# Altium footprint library YQPOWER.PcbLib: 215 footprints (part 4 of 14)
Each footprint in its own frame and in the unit in brackets; x right, y up, seen from the top. Pads: shape width x height; smd on the part's side, far side on the other; paste and mask are expansions set on the pad; w line width, h text height; cw(c..) or ccw(c..) is an arc to the next point about the centre after c.
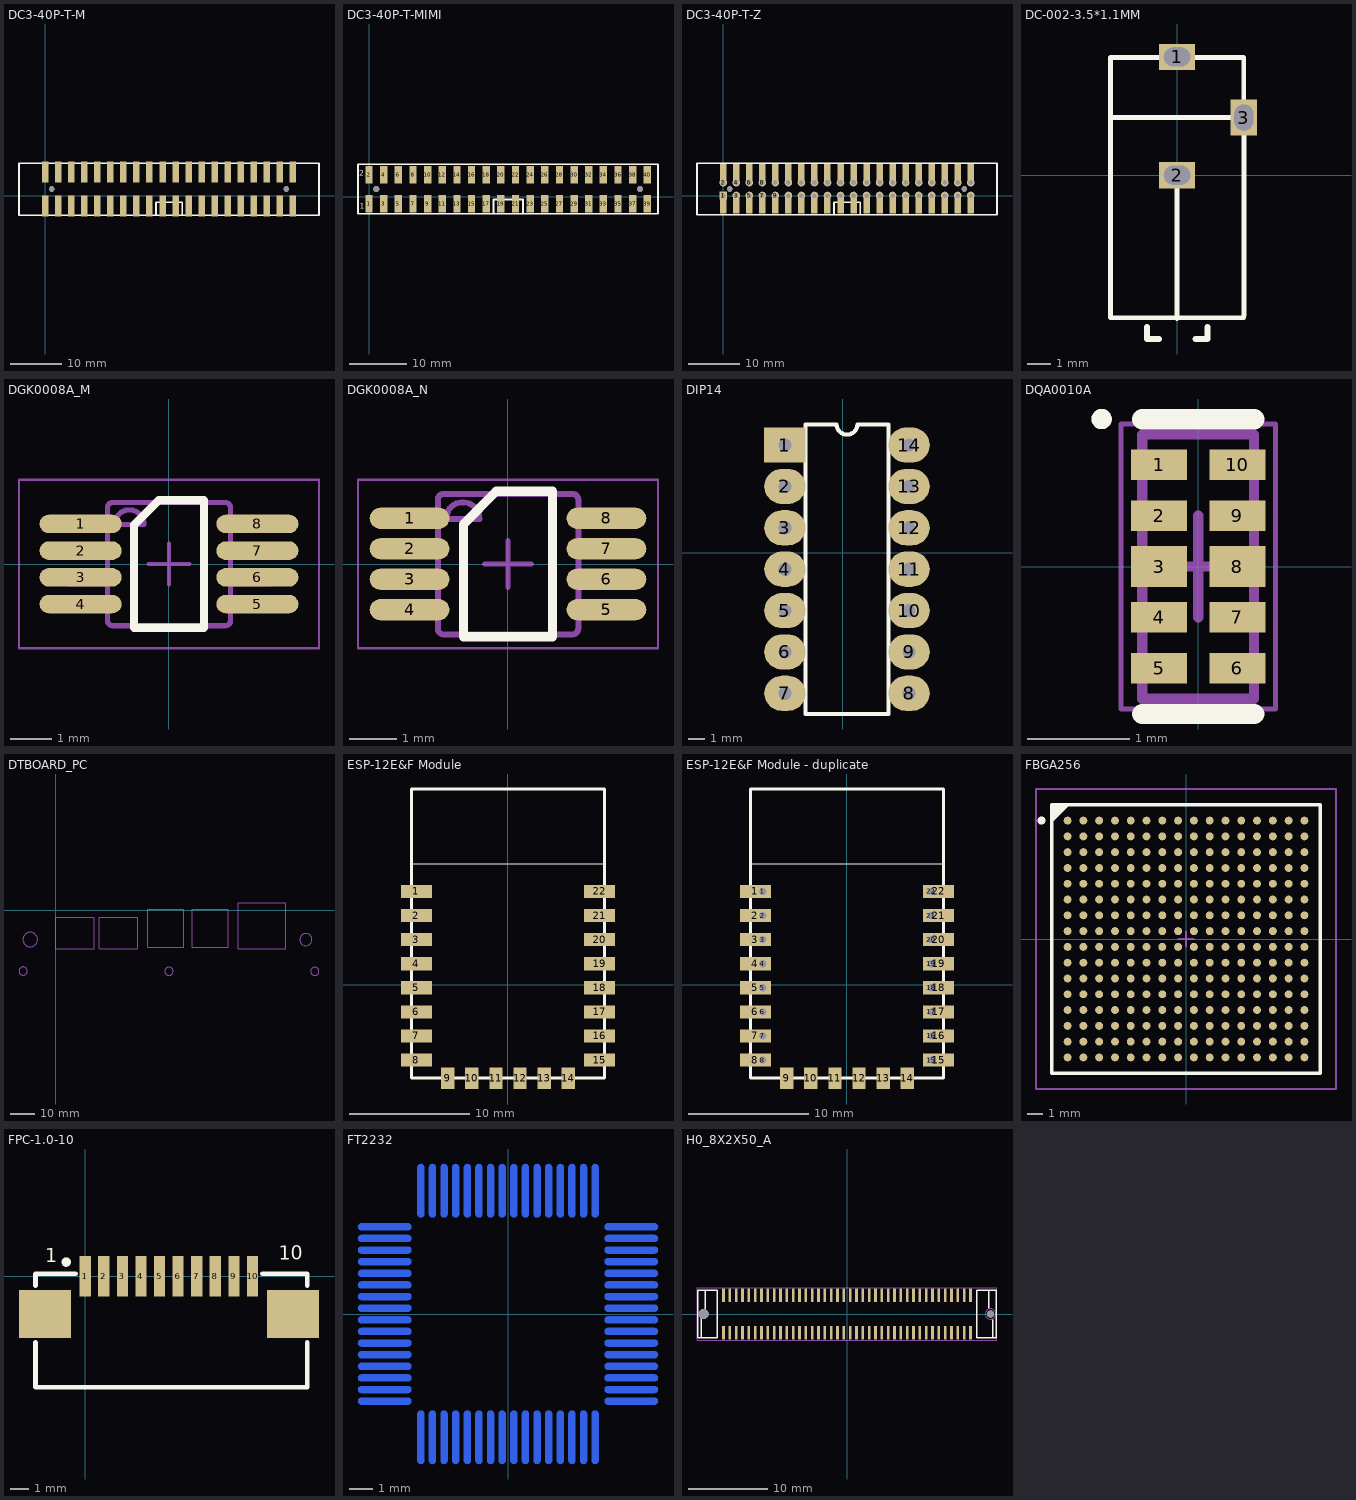
[diagram p3: the footprints below, top view; thin cyan lines are the x and y axes]

## DC3-40P-T-M [mil] "Connector; Header; 20x2 Position"
pads (42):
  round 39.37 hole 45.28: 0(50,51.57) 0(1850,51.57)
  rect 50x160 smd: 1(0,-77.87) 2(0,181.02) 3(100,-77.87) 4(100,181.02) 5(200,-77.87) 6(200,181.02) 7(300,-77.87) 8(300,181.02) 9(400,-77.87) 10(400,181.02) 11(500,-77.87) 12(500,181.02) 13(600,-77.87) 14(600,181.02) 15(700,-77.87) 16(700,181.02) 17(800,-77.87) 18(800,181.02) 19(900,-77.87) 20(900,181.02) 21(1000,-77.87) 22(1000,181.02) 23(1100,-77.87) 24(1100,181.02) 25(1200,-77.87) 26(1200,181.02) 27(1300,-77.87) 28(1300,181.02) 29(1400,-77.87) 30(1400,181.02) 31(1500,-77.87) 32(1500,181.02) 33(1600,-77.87) 34(1600,181.02) 35(1700,-77.87) 36(1700,181.02) 37(1800,-77.87) 38(1800,181.02) 39(1900,-77.87) 40(1900,181.02)
Top Overlay:
  lines w11.81: 850,-147.64 850,-50 1050,-50 1050,-147.64 ; -201.57,-148.82 -201.57,249.61 2101.18,249.61 2101.18,-148.82 -201.57,-148.82

## DC3-40P-T-MIMI [mil] "Connector; Header; 20x2 Position"
pads (42):
  round 39.37 hole 43.31: 0(50,51.57) 0(1850,51.57)
  rect 50x120 smd: 1(0,-47.87) 2(0,150) 3(100,-47.87) 4(100,150) 5(200,-47.87) 6(200,150) 7(300,-47.87) 8(300,150) 9(400,-47.87) 10(400,150) 11(500,-47.87) 12(500,150) 13(600,-47.87) 14(600,150) 15(700,-47.87) 16(700,150) 17(800,-47.87) 18(800,150) 19(900,-47.87) 20(900,150) 21(1000,-47.87) 22(1000,150) 23(1100,-47.87) 24(1100,150) 25(1200,-47.87) 26(1200,150) 27(1300,-47.87) 28(1300,150) 29(1400,-47.87) 30(1400,150) 31(1500,-47.87) 32(1500,150) 33(1600,-47.87) 34(1600,150) 35(1700,-47.87) 36(1700,150) 37(1800,-47.87) 38(1800,150) 39(1900,-47.87) 40(1900,150)
Top Overlay:
  lines w11.81: 850.39,-117.32 850.39,-19.68 1050.39,-19.68 1050.39,-117.32 ; -75.59,-117.32 -75.59,220.87 1972.83,220.87 1972.83,-117.32 -75.59,-117.32
  text "1" at -62.99,-97.64 h65
  text "2" at -65.75,129.92 h65

## DC3-40P-T-Z [mm] "Connector; Header; 20x2 Position"
pads (82):
  round 1 hole 1.15: 0(1.27,1.31) 0(46.99,1.31)
  rect 1.27x3.556 smd: 1(0,-1.738) 2(0,4.358) 3(2.54,-1.738) 4(2.54,4.358) 5(5.08,-1.738) 6(5.08,4.358) 7(7.62,-1.738) 8(7.62,4.358) 9(10.16,-1.738) 10(10.16,4.358) 11(12.7,-1.738) 12(12.7,4.358) 13(15.24,-1.738) 14(15.24,4.358) 15(17.78,-1.738) 16(17.78,4.358) 17(20.32,-1.738) 18(20.32,4.358) 19(22.86,-1.738) 20(22.86,4.358) 21(25.4,-1.738) 22(25.4,4.358) 23(27.94,-1.738) 24(27.94,4.358) 25(30.48,-1.738) 26(30.48,4.358) 27(33.02,-1.738) 28(33.02,4.358) 29(35.56,-1.738) 30(35.56,4.358) 31(38.1,-1.738) 32(38.1,4.358) 33(40.64,-1.738) 34(40.64,4.358) 35(43.18,-1.738) 36(43.18,4.358) 37(45.72,-1.738) 38(45.72,4.358) 39(48.26,-1.738) 40(48.26,4.358)
  rect 1.5x1.5 hole 0.9: 1(0,0)
  round 1.5 hole 0.9: 2(0,2.54) 3(2.54,0) 4(2.54,2.54) 5(5.08,0) 6(5.08,2.54) 7(7.62,0) 8(7.62,2.54) 9(10.16,0) 10(10.16,2.54) 11(12.7,0) 12(12.7,2.54) 13(15.24,0) 14(15.24,2.54) 15(17.78,0) 16(17.78,2.54) 17(20.32,0) 18(20.32,2.54) 19(22.86,0) 20(22.86,2.54) 21(25.4,0) 22(25.4,2.54) 23(27.94,0) 24(27.94,2.54) 25(30.48,0) 26(30.48,2.54) 27(33.02,0) 28(33.02,2.54) 29(35.56,0) 30(35.56,2.54) 31(38.1,0) 32(38.1,2.54) 33(40.64,0) 34(40.64,2.54) 35(43.18,0) 36(43.18,2.54) 37(45.72,0) 38(45.72,2.54) 39(48.26,0) 40(48.26,2.54)
Top Overlay:
  lines w0.3: 21.59,-3.75 21.59,-1.27 26.67,-1.27 26.67,-3.75 ; -5.12,-3.78 -5.12,6.34 53.37,6.34 53.37,-3.78 -5.12,-3.78

## DC-002-3.5*1.1MM [mm]
pads (3):
  rect 1.5x1.1 hole 0.8 slot 1.1 at 0 deg: 1(0,4.953) 2(0,0)
  rect 1.1x1.5 hole 0.8 slot 1.1 at 90 deg: 3(2.794,2.413)
Top Overlay:
  lines w0.2: -2.8,2.413 0,2.413 2.8,2.413 2.8,-5.887 ; 0,-6 0,0 ; -2.794,-5.969 -2.794,4.931 2.794,4.931 2.794,-5.969 -2.794,-5.969
  lines w0.254: -1.27,-6.35 -1.27,-6.858 -0.762,-6.858 ; 0.762,-6.858 1.27,-6.858 1.27,-6.35

## DGK0008A_M [mm] "TSOP, 8-Leads, Body 3x3mm, Pitch 0.65mm, IPC Low Density"
height 1.1
pads (8):
  oval 2x0.45 smd mask+0.05: 1(-2.15,0.975) 2(-2.15,0.325) 3(-2.15,-0.325) 4(-2.15,-0.975) 5(2.15,-0.975) 6(2.15,-0.325) 7(2.15,0.325) 8(2.15,0.975)
Top Overlay:
  lines w0.2: -0.85,-1.55 0.85,-1.55 0.85,1.55 -0.25,1.55 -0.85,0.95 -0.85,-1.55
Mechanical 5:
  lines w0.127: -2.45,-1.131 -2.21,-1.131 -2.091,-1.131 -2.087,-1.131 -1.784,-1.131 -1.498,-1.131 -1.498,-0.826 -1.784,-0.826 -2.087,-0.826 -2.091,-0.826 -2.21,-0.826 -2.45,-0.826 -2.45,-1.131 ; -2.45,-0.48 -2.21,-0.48 -2.091,-0.48 -2.087,-0.48 -1.784,-0.48 -1.498,-0.48 -1.498,-0.175 -1.784,-0.175 -2.087,-0.175 -2.091,-0.175 -2.21,-0.175 -2.45,-0.175 -2.45,-0.48 ; -2.45,0.17 -2.21,0.17 -2.091,0.17 -2.087,0.17 -1.784,0.17 -1.498,0.17 -1.498,0.475 -1.784,0.475 -2.087,0.475 -2.091,0.475 -2.21,0.475 -2.45,0.475 -2.45,0.17 ; -2.45,0.82 -2.21,0.82 -2.091,0.82 -2.087,0.82 -1.784,0.82 -1.498,0.82 -1.498,1.125 -1.784,1.125 -2.087,1.125 -2.091,1.125 -2.21,1.125 -2.45,1.125 -2.45,0.82 ; -1.497,-1.377 ccw(c-1.37,-1.374) -1.373,-1.501 -1.371,-1.501 1.373,-1.501 1.375,-1.501 ccw(c1.373,-1.374) 1.5,-1.377 1.5,-1.374 1.5,1.369 1.5,1.372 ccw(c1.373,1.369) 1.375,1.496 1.373,1.496 -1.371,1.496 -1.373,1.496 ccw(c-1.37,1.369) -1.497,1.372 -1.498,1.369 -1.498,-1.374 -1.497,-1.377 ; -1.32,0.962 cw(c-0.964,0.962) -0.609,0.962 -1.32,0.962 ; 1.5,-1.131 1.5,-0.826 1.786,-0.826 2.089,-0.826 2.093,-0.826 2.213,-0.826 2.452,-0.826 2.452,-1.131 2.213,-1.131 2.093,-1.131 2.089,-1.131 1.786,-1.131 1.5,-1.131 ; 1.5,-0.48 1.5,-0.175 1.786,-0.175 2.089,-0.175 2.093,-0.175 2.213,-0.175 2.452,-0.175 2.452,-0.48 2.213,-0.48 2.093,-0.48 2.089,-0.48 1.786,-0.48 1.5,-0.48 ; 1.5,0.17 1.5,0.475 1.786,0.475 2.089,0.475 2.093,0.475 2.213,0.475 2.452,0.475 2.452,0.17 2.213,0.17 2.093,0.17 2.089,0.17 1.786,0.17 1.5,0.17 ; 1.5,0.82 1.5,1.125 1.786,1.125 2.089,1.125 2.093,1.125 2.213,1.125 2.452,1.125 2.452,0.82 2.213,0.82 2.093,0.82 2.089,0.82 1.786,0.82 1.5,0.82
Mechanical 15:
  lines w0.05: -3.65,-2.05 3.65,-2.05 3.65,2.05 -3.65,2.05 -3.65,-2.05
  lines w0.1: -0.5,0 0.5,0 ; 0,-0.5 0,0.5
3D body "DGK0008AakaMUA08A.stp": height 0.94, standoff -0.02, extent -2.451,-1.499 2.451,1.498

## DGK0008A_N [mm] "TSOP, 8-Leads, Body 3x3mm, Pitch 0.65mm, IPC Medium Density"
height 1.1
pads (8):
  oval 1.7x0.45 smd mask+0.05: 1(-2.1,0.975) 2(-2.1,0.325) 3(-2.1,-0.325) 4(-2.1,-0.975) 5(2.1,-0.975) 6(2.1,-0.325) 7(2.1,0.325) 8(2.1,0.975)
Top Overlay:
  lines w0.2: -0.95,-1.55 -0.95,0.85 -0.25,1.55 0.95,1.55 0.95,-1.55 -0.95,-1.55
Mechanical 5:
  lines w0.127: -2.45,-1.131 -2.45,-0.826 -2.21,-0.826 -2.091,-0.826 -2.087,-0.826 -1.784,-0.826 -1.498,-0.826 -1.498,-1.131 -1.784,-1.131 -2.087,-1.131 -2.091,-1.131 -2.21,-1.131 -2.45,-1.131 ; -2.45,-0.48 -2.45,-0.175 -2.21,-0.175 -2.091,-0.175 -2.087,-0.175 -1.784,-0.175 -1.498,-0.175 -1.498,-0.48 -1.784,-0.48 -2.087,-0.48 -2.091,-0.48 -2.21,-0.48 -2.45,-0.48 ; -2.45,0.17 -2.45,0.475 -2.21,0.475 -2.091,0.475 -2.087,0.475 -1.784,0.475 -1.498,0.475 -1.498,0.17 -1.784,0.17 -2.087,0.17 -2.091,0.17 -2.21,0.17 -2.45,0.17 ; -2.45,0.82 -2.45,1.125 -2.21,1.125 -2.091,1.125 -2.087,1.125 -1.784,1.125 -1.498,1.125 -1.498,0.82 -1.784,0.82 -2.087,0.82 -2.091,0.82 -2.21,0.82 -2.45,0.82 ; -1.497,-1.377 ccw(c-1.37,-1.374) -1.373,-1.501 -1.371,-1.501 1.373,-1.501 1.375,-1.501 ccw(c1.373,-1.374) 1.5,-1.377 1.5,-1.374 1.5,1.369 1.5,1.372 ccw(c1.373,1.369) 1.375,1.496 1.373,1.496 -1.371,1.496 -1.373,1.496 ccw(c-1.37,1.369) -1.497,1.372 -1.498,1.369 -1.498,-1.374 -1.497,-1.377 ; -1.32,0.962 cw(c-0.964,0.962) -0.609,0.962 -1.32,0.962 ; 1.5,-1.131 1.786,-1.131 2.089,-1.131 2.093,-1.131 2.213,-1.131 2.452,-1.131 2.452,-0.826 2.213,-0.826 2.093,-0.826 2.089,-0.826 1.786,-0.826 1.5,-0.826 1.5,-1.131 ; 1.5,-0.48 1.786,-0.48 2.089,-0.48 2.093,-0.48 2.213,-0.48 2.452,-0.48 2.452,-0.175 2.213,-0.175 2.093,-0.175 2.089,-0.175 1.786,-0.175 1.5,-0.175 1.5,-0.48 ; 1.5,0.17 1.786,0.17 2.089,0.17 2.093,0.17 2.213,0.17 2.452,0.17 2.452,0.475 2.213,0.475 2.093,0.475 2.089,0.475 1.786,0.475 1.5,0.475 1.5,0.17 ; 1.5,0.82 1.786,0.82 2.089,0.82 2.093,0.82 2.213,0.82 2.452,0.82 2.452,1.125 2.213,1.125 2.093,1.125 2.089,1.125 1.786,1.125 1.5,1.125 1.5,0.82
  text ".Designator" at -1.15,-0.3 h0.64
Mechanical 15:
  lines w0.05: -3.2,-1.8 3.2,-1.8 3.2,1.8 -3.2,1.8 -3.2,-1.8
  lines w0.1: -0.5,0 0.5,0 ; 0,-0.5 0,0.5
3D body "DGK0008AakaMUA08A.stp": height 0.94, standoff -0.02, extent -2.451,-1.499 2.451,1.498

## DIP14 [mil]
pads (14):
  rect 100x85 hole 32: 1(-140,260)
  oval 100x85 hole 32: 2(-140,160) 3(-140,60) 4(-140,-40) 5(-140,-140) 6(-140,-240) 7(-140,-340) 8(160,-340) 9(160,-240) 10(160,-140) 11(160,-40) 12(160,60) 13(160,160) 14(160,260)
Top Overlay:
  lines w10: -90,-390 -90,310 -15,310 ccw(c10,310) 35,310 110,310 110,-390 -90,-390

## DIP64 [mm]

## DQA0010A [mm] "SON, 10-Leads, Body 1x2.5mm, Pitch 0.5mm, TI Recommended"
height 0.55
pads (10):
  rect 0.55x0.3 smd paste+0 mask+0.05: 1(-0.385,1) 2(-0.385,0.5) 4(-0.385,-0.5) 5(-0.385,-1) 6(0.385,-1) 7(0.385,-0.5) 9(0.385,0.5) 10(0.385,1)
  rect 0.55x0.4 smd paste+0 mask+0.05: 3(-0.385,0) 8(0.385,0)
Top Overlay:
  circle w0.1: c-0.95,1.45 r0.05
  lines w0.2: -0.55,-1.45 0.55,-1.45 ; -0.55,1.45 0.55,1.45
Mechanical 5:
  circle w0.1: c-0.95,1.45 r0.05
  lines w0.1: -0.55,-1.3 0.55,-1.3 0.55,1.3 -0.55,1.3 -0.55,-1.3
  text ".Designator" at -0.254,1.016 h0.51
Mechanical 15:
  lines w0.05: -0.76,-1.4 0.76,-1.4 0.76,1.4 -0.76,1.4 -0.76,-1.4
  lines w0.1: -0.5,0 0.5,0 ; 0,-0.5 0,0.5
3D body: height 0.55, standoff 0, extent -0.55,-1.3 0.55,1.3

## DTBOARD_PC [mm]
Mechanical 1:
  lines w0.1: -13.568,-26.716 cw(c-13.462,-25.019) -13.547,-26.717 ; -10.728,-15.059 cw(c-10.541,-12.065) -10.691,-15.061 ; 37.719,-15.24 52.578,-15.24 ; 37.719,-15.219 37.719,0.381 52.578,0.381 52.578,-15.219 ; 46.432,-26.843 cw(c46.538,-25.146) 46.453,-26.844 ; 56.134,-15.24 70.993,-15.24 ; 56.134,-15.219 56.134,0.381 70.993,0.381 70.993,-15.219 ; 75.057,-15.875 94.557,-15.875 ; 75.057,-15.825 75.057,3.175 94.557,3.175 ; 94.615,-15.825 94.615,3.175 ; 102.714,-14.576 cw(c102.87,-12.081) 102.745,-14.578 ; 106.447,-26.843 cw(c106.553,-25.146) 106.468,-26.844 ; 0,-15.875 15.875,-15.875 15.875,-2.794 0,-2.794 0,-15.875 ; 17.78,-15.875 17.78,-2.794 33.655,-2.794 33.655,-15.875 17.78,-15.875

## ESP-12E&F Module [mm]
pads (22):
  rect 2.6x1.1 smd: 1(-7.6,7.75) 2(-7.6,5.75) 3(-7.6,3.75) 4(-7.6,1.75) 5(-7.6,-0.25) 6(-7.6,-2.25) 7(-7.6,-4.25) 8(-7.6,-6.25) 15(7.6,-6.25) 16(7.6,-4.25) 17(7.6,-2.25) 18(7.6,-0.25) 19(7.6,1.75) 20(7.6,3.75) 21(7.6,5.75) 22(7.6,7.75)
  rect 1.1x1.8 smd: 9(-5,-7.75) 10(-3,-7.75) 11(-1,-7.75) 12(1,-7.75) 13(3,-7.75) 14(5,-7.75)
Top Overlay:
  lines w0.1: -8,10.05 8,10.05
  lines w0.254: -8,-7.75 -8,16.25 8,16.25 8,-7.75 -8,-7.75

## ESP-12E&F Module - duplicate [mm]
pads (38):
  rect 2.6x1.1 smd: 1(-7.6,7.75) 2(-7.6,5.75) 3(-7.6,3.75) 4(-7.6,1.75) 5(-7.6,-0.25) 6(-7.6,-2.25) 7(-7.6,-4.25) 8(-7.6,-6.25) 15(7.6,-6.25) 16(7.6,-4.25) 17(7.6,-2.25) 18(7.6,-0.25) 19(7.6,1.75) 20(7.6,3.75) 21(7.6,5.75) 22(7.6,7.75)
  rect 0.762x1 hole 0.6: 1(-7,7.75) 7(-7,-4.25)
  rect 0.762x1 / inner rect 0.762x1 / far side rect 1x1 hole 0.6: 2(-7,5.75) 3(-7,3.75) 4(-7,1.75) 5(-7,-0.25) 6(-7,-2.25) 8(-7,-6.25) 15(7,-6.25) 16(7,-4.25) 17(7,-2.25) 18(7,-0.25) 19(7,1.75) 20(7,3.75) 21(7,5.75) 22(7,7.75)
  rect 1.1x1.8 smd: 9(-5,-7.75) 10(-3,-7.75) 11(-1,-7.75) 12(1,-7.75) 13(3,-7.75) 14(5,-7.75)
Top Overlay:
  lines w0.1: -8,10.05 8,10.05
  lines w0.254: -8,-7.75 8,-7.75 8,16.25 -8,16.25 -8,-7.75

## FBGA256 [mm] "256-Ball FineLine Ball Grid Array (FBGA256) - Option 1"
height 2.2
pads (256):
  round 0.5 smd: A1(-7.5,7.5) A2(-6.5,7.5) A3(-5.5,7.5) A4(-4.5,7.5) A5(-3.5,7.5) A6(-2.5,7.5) A7(-1.5,7.5) A8(-0.5,7.5) A9(0.5,7.5) A10(1.5,7.5) A11(2.5,7.5) A12(3.5,7.5) A13(4.5,7.5) A14(5.5,7.5) A15(6.5,7.5) A16(7.5,7.5) B1(-7.5,6.5) B2(-6.5,6.5) B3(-5.5,6.5) B4(-4.5,6.5) B5(-3.5,6.5) B6(-2.5,6.5) B7(-1.5,6.5) B8(-0.5,6.5) B9(0.5,6.5) B10(1.5,6.5) B11(2.5,6.5) B12(3.5,6.5) B13(4.5,6.5) B14(5.5,6.5) B15(6.5,6.5) B16(7.5,6.5) C1(-7.5,5.5) C2(-6.5,5.5) C3(-5.5,5.5) C4(-4.5,5.5) C5(-3.5,5.5) C6(-2.5,5.5) C7(-1.5,5.5) C8(-0.5,5.5) C9(0.5,5.5) C10(1.5,5.5) C11(2.5,5.5) C12(3.5,5.5) C13(4.5,5.5) C14(5.5,5.5) C15(6.5,5.5) C16(7.5,5.5) D1(-7.5,4.5) D2(-6.5,4.5) D3(-5.5,4.5) D4(-4.5,4.5) D5(-3.5,4.5) D6(-2.5,4.5) D7(-1.5,4.5) D8(-0.5,4.5) D9(0.5,4.5) D10(1.5,4.5) D11(2.5,4.5) D12(3.5,4.5) D13(4.5,4.5) D14(5.5,4.5) D15(6.5,4.5) D16(7.5,4.5) E1(-7.5,3.5) E2(-6.5,3.5) E3(-5.5,3.5) E4(-4.5,3.5) E5(-3.5,3.5) E6(-2.5,3.5) E7(-1.5,3.5) E8(-0.5,3.5) E9(0.5,3.5) E10(1.5,3.5) E11(2.5,3.5) E12(3.5,3.5) E13(4.5,3.5) E14(5.5,3.5) E15(6.5,3.5) E16(7.5,3.5) F1(-7.5,2.5) F2(-6.5,2.5) F3(-5.5,2.5) F4(-4.5,2.5) F5(-3.5,2.5) F6(-2.5,2.5) F7(-1.5,2.5) F8(-0.5,2.5) F9(0.5,2.5) F10(1.5,2.5) F11(2.5,2.5) F12(3.5,2.5) F13(4.5,2.5) F14(5.5,2.5) F15(6.5,2.5) F16(7.5,2.5) G1(-7.5,1.5) G2(-6.5,1.5) G3(-5.5,1.5) G4(-4.5,1.5) G5(-3.5,1.5) G6(-2.5,1.5) G7(-1.5,1.5) G8(-0.5,1.5) G9(0.5,1.5) G10(1.5,1.5) G11(2.5,1.5) G12(3.5,1.5) G13(4.5,1.5) G14(5.5,1.5) G15(6.5,1.5) G16(7.5,1.5) H1(-7.5,0.5) H2(-6.5,0.5) H3(-5.5,0.5) H4(-4.5,0.5) H5(-3.5,0.5) H6(-2.5,0.5) H7(-1.5,0.5) H8(-0.5,0.5) H9(0.5,0.5) H10(1.5,0.5) H11(2.5,0.5) H12(3.5,0.5) H13(4.5,0.5) H14(5.5,0.5) H15(6.5,0.5) H16(7.5,0.5) J1(-7.5,-0.5) J2(-6.5,-0.5) J3(-5.5,-0.5) J4(-4.5,-0.5) J5(-3.5,-0.5) J6(-2.5,-0.5) J7(-1.5,-0.5) J8(-0.5,-0.5) J9(0.5,-0.5) J10(1.5,-0.5) J11(2.5,-0.5) J12(3.5,-0.5) J13(4.5,-0.5) J14(5.5,-0.5) J15(6.5,-0.5) J16(7.5,-0.5) K1(-7.5,-1.5) K2(-6.5,-1.5) K3(-5.5,-1.5) K4(-4.5,-1.5) K5(-3.5,-1.5) K6(-2.5,-1.5) K7(-1.5,-1.5) K8(-0.5,-1.5) K9(0.5,-1.5) K10(1.5,-1.5) K11(2.5,-1.5) K12(3.5,-1.5) K13(4.5,-1.5) K14(5.5,-1.5) K15(6.5,-1.5) K16(7.5,-1.5) L1(-7.5,-2.5) L2(-6.5,-2.5) L3(-5.5,-2.5) L4(-4.5,-2.5) L5(-3.5,-2.5) L6(-2.5,-2.5) L7(-1.5,-2.5) L8(-0.5,-2.5) L9(0.5,-2.5) L10(1.5,-2.5) L11(2.5,-2.5) L12(3.5,-2.5) L13(4.5,-2.5) L14(5.5,-2.5) L15(6.5,-2.5) L16(7.5,-2.5) M1(-7.5,-3.5) M2(-6.5,-3.5) M3(-5.5,-3.5) M4(-4.5,-3.5) M5(-3.5,-3.5) M6(-2.5,-3.5) M7(-1.5,-3.5) M8(-0.5,-3.5) M9(0.5,-3.5) M10(1.5,-3.5) M11(2.5,-3.5) M12(3.5,-3.5) M13(4.5,-3.5) M14(5.5,-3.5) M15(6.5,-3.5) M16(7.5,-3.5) N1(-7.5,-4.5) N2(-6.5,-4.5) N3(-5.5,-4.5) N4(-4.5,-4.5) N5(-3.5,-4.5) N6(-2.5,-4.5) N7(-1.5,-4.5) N8(-0.5,-4.5) N9(0.5,-4.5) N10(1.5,-4.5) N11(2.5,-4.5) N12(3.5,-4.5) N13(4.5,-4.5) N14(5.5,-4.5) N15(6.5,-4.5) N16(7.5,-4.5) P1(-7.5,-5.5) P2(-6.5,-5.5) P3(-5.5,-5.5) P4(-4.5,-5.5) P5(-3.5,-5.5) P6(-2.5,-5.5) P7(-1.5,-5.5) P8(-0.5,-5.5) P9(0.5,-5.5) P10(1.5,-5.5) P11(2.5,-5.5) P12(3.5,-5.5) P13(4.5,-5.5) P14(5.5,-5.5) P15(6.5,-5.5) P16(7.5,-5.5) R1(-7.5,-6.5) R2(-6.5,-6.5) R3(-5.5,-6.5) R4(-4.5,-6.5) R5(-3.5,-6.5) R6(-2.5,-6.5) R7(-1.5,-6.5) R8(-0.5,-6.5) R9(0.5,-6.5) R10(1.5,-6.5) R11(2.5,-6.5) R12(3.5,-6.5) R13(4.5,-6.5) R14(5.5,-6.5) R15(6.5,-6.5) R16(7.5,-6.5) T1(-7.5,-7.5) T2(-6.5,-7.5) T3(-5.5,-7.5) T4(-4.5,-7.5) T5(-3.5,-7.5) T6(-2.5,-7.5) T7(-1.5,-7.5) T8(-0.5,-7.5) T9(0.5,-7.5) T10(1.5,-7.5) T11(2.5,-7.5) T12(3.5,-7.5) T13(4.5,-7.5) T14(5.5,-7.5) T15(6.5,-7.5) T16(7.5,-7.5)
Top Overlay:
  circle w0.25: c-9.15,7.5 r0.125
  region: -7.5,8.5 -8.5,7.5 -8.5,8.5
  lines w0.2: -8.5,7.5 -7.5,8.5 ; -8.5,-8.5 -8.5,8.5 8.5,8.5 8.5,-8.5 -8.5,-8.5
Mechanical 13:
  lines w0.1: -8.5,-8.5 -8.5,8.5 8.5,8.5 8.5,-8.5 -8.5,-8.5
Mechanical 15:
  lines w0.1: -0.5,0 0.5,0 ; 0,-0.5 0,0.5 ; -9.5,-9.5 -9.5,9.5 9.5,9.5 9.5,-9.5 -9.5,-9.5
3D body: height 2.2, standoff 0, extent -8.5,-8.5 8.5,8.5

## FPC-1.0-10 [mm]
height 10.16
pads (12):
  rect 0.6x2.2 smd: 1(0,0) 2(1,0) 3(2,0) 4(3,0) 5(4,0) 6(5,0) 7(6,0) 8(7,0) 9(8,0) 10(9,0)
  rect 2.8x2.6 smd: ""(-2.159,-2.032) ""(11.176,-2.032)
Top Overlay:
  circle w0.254: c-1.016,0.762 r0.127
  lines w0.254: -2.667,-3.556 -2.667,-5.969 11.938,-5.969 11.938,-3.556 ; -2.667,-0.508 -2.667,0.127 -0.508,0.127 ; 9.525,0.127 11.938,0.127 11.938,-0.508
  text "1" at -2.159,0.508 h1.27
  text "10" at 10.414,0.635 h1.27

## FT2232 [mm] "Thin QFP, 64-Leads, Body 10x10mm, Pitch 0.5mm, IPC Medium Density"
height 1.6
pads (64):
  oval 2.3x0.3 smd far side: 1(-5.3,-3.75) 2(-5.3,-3.25) 3(-5.3,-2.75) 4(-5.3,-2.25) 5(-5.3,-1.75) 6(-5.3,-1.25) 7(-5.3,-0.75) 8(-5.3,-0.25) 9(-5.3,0.25) 10(-5.3,0.75) 11(-5.3,1.25) 12(-5.3,1.75) 13(-5.3,2.25) 14(-5.3,2.75) 15(-5.3,3.25) 16(-5.3,3.75) 33(5.3,3.75) 34(5.3,3.25) 35(5.3,2.75) 36(5.3,2.25) 37(5.3,1.75) 38(5.3,1.25) 39(5.3,0.75) 40(5.3,0.25) 41(5.3,-0.25) 42(5.3,-0.75) 43(5.3,-1.25) 44(5.3,-1.75) 45(5.3,-2.25) 46(5.3,-2.75) 47(5.3,-3.25) 48(5.3,-3.75)
  oval 0.3x2.3 smd far side: 17(-3.75,5.3) 18(-3.25,5.3) 19(-2.75,5.3) 20(-2.25,5.3) 21(-1.75,5.3) 22(-1.25,5.3) 23(-0.75,5.3) 24(-0.25,5.3) 25(0.25,5.3) 26(0.75,5.3) 27(1.25,5.3) 28(1.75,5.3) 29(2.25,5.3) 30(2.75,5.3) 31(3.25,5.3) 32(3.75,5.3) 49(3.75,-5.3) 50(3.25,-5.3) 51(2.75,-5.3) 52(2.25,-5.3) 53(1.75,-5.3) 54(1.25,-5.3) 55(0.75,-5.3) 56(0.25,-5.3) 57(-0.25,-5.3) 58(-0.75,-5.3) 59(-1.25,-5.3) 60(-1.75,-5.3) 61(-2.25,-5.3) 62(-2.75,-5.3) 63(-3.25,-5.3) 64(-3.75,-5.3)
Bottom Overlay:
  circle w0.25: c-3.173,-3.175 r0.125

## H0_8X2X50_A [mm] "H0_8X2X50_B -MU"
pads (82):
  rect 0.35x1.7 smd: 1(15.601,2.35) 2(14.801,2.35) 3(14,2.35) 4(13.2,2.35) 5(12.401,2.35) 6(11.6,2.35) 7(10.8,2.35) 8(10,2.35) 9(9.2,2.35) 10(8.401,2.35) 11(7.6,2.35) 12(6.8,2.35) 13(5.999,2.35) 14(5.199,2.35) 15(4.4,2.35) 16(3.599,2.35) 17(2.799,2.35) 18(1.999,2.35) 19(1.199,2.35) 20(0.4,2.35) 21(-0.401,2.35) 22(-1.201,2.35) 23(-2.001,2.35) 24(-2.801,2.35) 25(-3.6,2.35) 26(-4.4,2.35) 27(-5.201,2.35) 28(-6.001,2.35) 29(-6.801,2.35) 30(-7.6,2.35) 31(-8.401,2.35) 32(-9.201,2.35) 33(-10,2.35) 34(-10.801,2.35) 35(-11.6,2.35) 36(-12.401,2.35) 37(-13.201,2.35) 38(-14,2.35) 39(-14.801,2.35) 40(-15.6,2.35) 41(-15.6,-2.35) 42(-14.801,-2.35) 43(-14,-2.35) 44(-13.201,-2.35) 45(-12.401,-2.35) 46(-11.6,-2.35) 47(-10.801,-2.35) 48(-10,-2.35) 49(-9.201,-2.35) 50(-8.401,-2.35) 51(-7.6,-2.35) 52(-6.801,-2.35) 53(-6.001,-2.35) 54(-5.201,-2.35) 55(-4.4,-2.35) 56(-3.6,-2.35) 57(-2.801,-2.35) 58(-2.001,-2.35) 59(-1.201,-2.35) 60(-0.401,-2.35) 61(0.4,-2.35) 62(1.199,-2.35) 63(1.999,-2.35) 64(2.799,-2.35) 65(3.599,-2.35) 66(4.4,-2.35) 67(5.199,-2.35) 68(5.999,-2.35) 69(6.8,-2.35) 70(7.6,-2.35) 71(8.401,-2.35) 72(9.2,-2.35) 73(10,-2.35) 74(10.8,-2.35) 75(11.6,-2.35) 76(12.401,-2.35) 77(13.2,-2.35) 78(14,-2.35) 79(14.801,-2.35) 80(15.601,-2.35)
  round 1.3 hole 1.3: " "(-18.125,0)
  round 0.9 hole 0.9: " "(18.125,0)
Top Overlay:
  lines w0.178: -18.4,-3 -18.4,-0.55 ; -17.901,0.55 -17.901,3 ; -16.376,2.975 -16.376,-3 -18.876,-3 -18.876,3 -16.376,3 ; 17.9,0.75 17.9,3 ; 18.401,-3 18.401,-0.75 ; 16.375,-3 16.375,3 18.876,3 18.876,-3 16.375,-3
Mechanical 10:
  text "7" at 13.2,2.604 h0.64
  text "9" at 12.401,2.604 h0.64
  text "10" at 12.401,-1.842 h0.64
  text "11" at 11.6,2.858 h0.64
  text "12" at 11.6,-1.842 h0.64
  text "13" at 10.8,2.858 h0.64
  text "8" at 13.2,-2.096 h0.64
  text "14" at 10.8,-1.842 h0.64
  text "16" at 10,-1.842 h0.64
  text "15" at 10,2.858 h0.64
  text "62" at -8.401,-1.842 h0.64
  text "22" at 7.6,-1.842 h0.64
  text "58" at -6.801,-1.842 h0.64
  text "54" at -5.201,-1.842 h0.64
  text "6" at 14,-2.096 h0.64
  text "5" at 14,2.604 h0.64
  text "4" at 14.801,-2.096 h0.64
  text "3" at 14.801,2.604 h0.64
  text "2" at 15.601,-2.096 h0.64
  text "1" at 15.601,2.604 h0.64
  text "30" at 4.4,-1.842 h0.64
  text "52" at -4.4,-1.842 h0.64
  text "34" at 2.799,-1.842 h0.64
  text "33" at 2.799,2.858 h0.64
  text "51" at -4.4,2.858 h0.64
  text "56" at -6.001,-1.842 h0.64
  text "55" at -6.001,2.858 h0.64
  text "75" at -14,2.858 h0.64
  text "74" at -13.201,-1.842 h0.64
  text "53" at -5.201,2.858 h0.64
  text "73" at -13.201,2.858 h0.64
  text "49" at -3.6,2.858 h0.64
  text "76" at -14,-1.842 h0.64
  text "60" at -7.6,-1.842 h0.64
  text "37" at 1.199,2.858 h0.64
  text "35" at 1.999,2.858 h0.64
  text "21" at 7.6,2.858 h0.64
  text "43" at -1.201,2.858 h0.64
  text "57" at -6.801,2.858 h0.64
  text "31" at 3.599,2.858 h0.64
  text "23" at 6.8,2.858 h0.64
  text "39" at 0.4,2.858 h0.64
  text "45" at -2.001,2.858 h0.64
  text "61" at -8.401,2.858 h0.64
  text "41" at -0.401,2.858 h0.64
  text "29" at 4.4,2.858 h0.64
  text "59" at -7.6,2.858 h0.64
  text "79" at -15.6,2.858 h0.64
  text "77" at -14.801,2.858 h0.64
  text "69" at -11.6,2.858 h0.64
  text "70" at -11.6,-1.842 h0.64
  text "71" at -12.401,2.858 h0.64
  text "19" at 8.401,2.858 h0.64
  text "17" at 9.2,2.858 h0.64
  text "20" at 8.401,-1.842 h0.64
  text "18" at 9.2,-1.842 h0.64
  text "78" at -14.801,-1.842 h0.64
  text "27" at 5.199,2.858 h0.64
  text "25" at 5.999,2.858 h0.64
  text "50" at -3.6,-1.842 h0.64
  text "48" at -2.801,-1.842 h0.64
  text "47" at -2.801,2.858 h0.64
  text "80" at -15.6,-1.842 h0.64
  text "63" at -9.201,2.858 h0.64
  text "68" at -10.801,-1.842 h0.64
  text "66" at -10,-1.842 h0.64
  text "72" at -12.401,-1.842 h0.64
  text "67" at -10.801,2.858 h0.64
  text "65" at -10,2.858 h0.64
  text "64" at -9.201,-1.842 h0.64
  text "42" at -0.401,-1.842 h0.64
  text "36" at 1.999,-1.842 h0.64
  text "40" at 0.4,-1.842 h0.64
  text "26" at 5.999,-1.842 h0.64
  text "44" at -1.201,-1.842 h0.64
  text "38" at 1.199,-1.842 h0.64
  text "24" at 6.8,-1.842 h0.64
  text "46" at -2.001,-1.842 h0.64
  text "28" at 5.199,-1.842 h0.64
  text "32" at 3.599,-1.842 h0.64
Mechanical 14:
  circle w0.025: c18.125,0 r0.65
  circle w0.025: c-18.125,0 r0.45
Mechanical 15:
  lines w0.025: -18.952,-3.302 18.952,-3.302 18.952,3.302 -18.952,3.302 -18.952,-3.302
Mechanical 16:
  text ".Designator" at 13.901,-5.204 h0.64